# Altium schematic symbol library Altium_Lib.SchLib: 403 symbols (part 1 of 4)
Pins are listed as number, name and electrical type; pins without a type are passive.

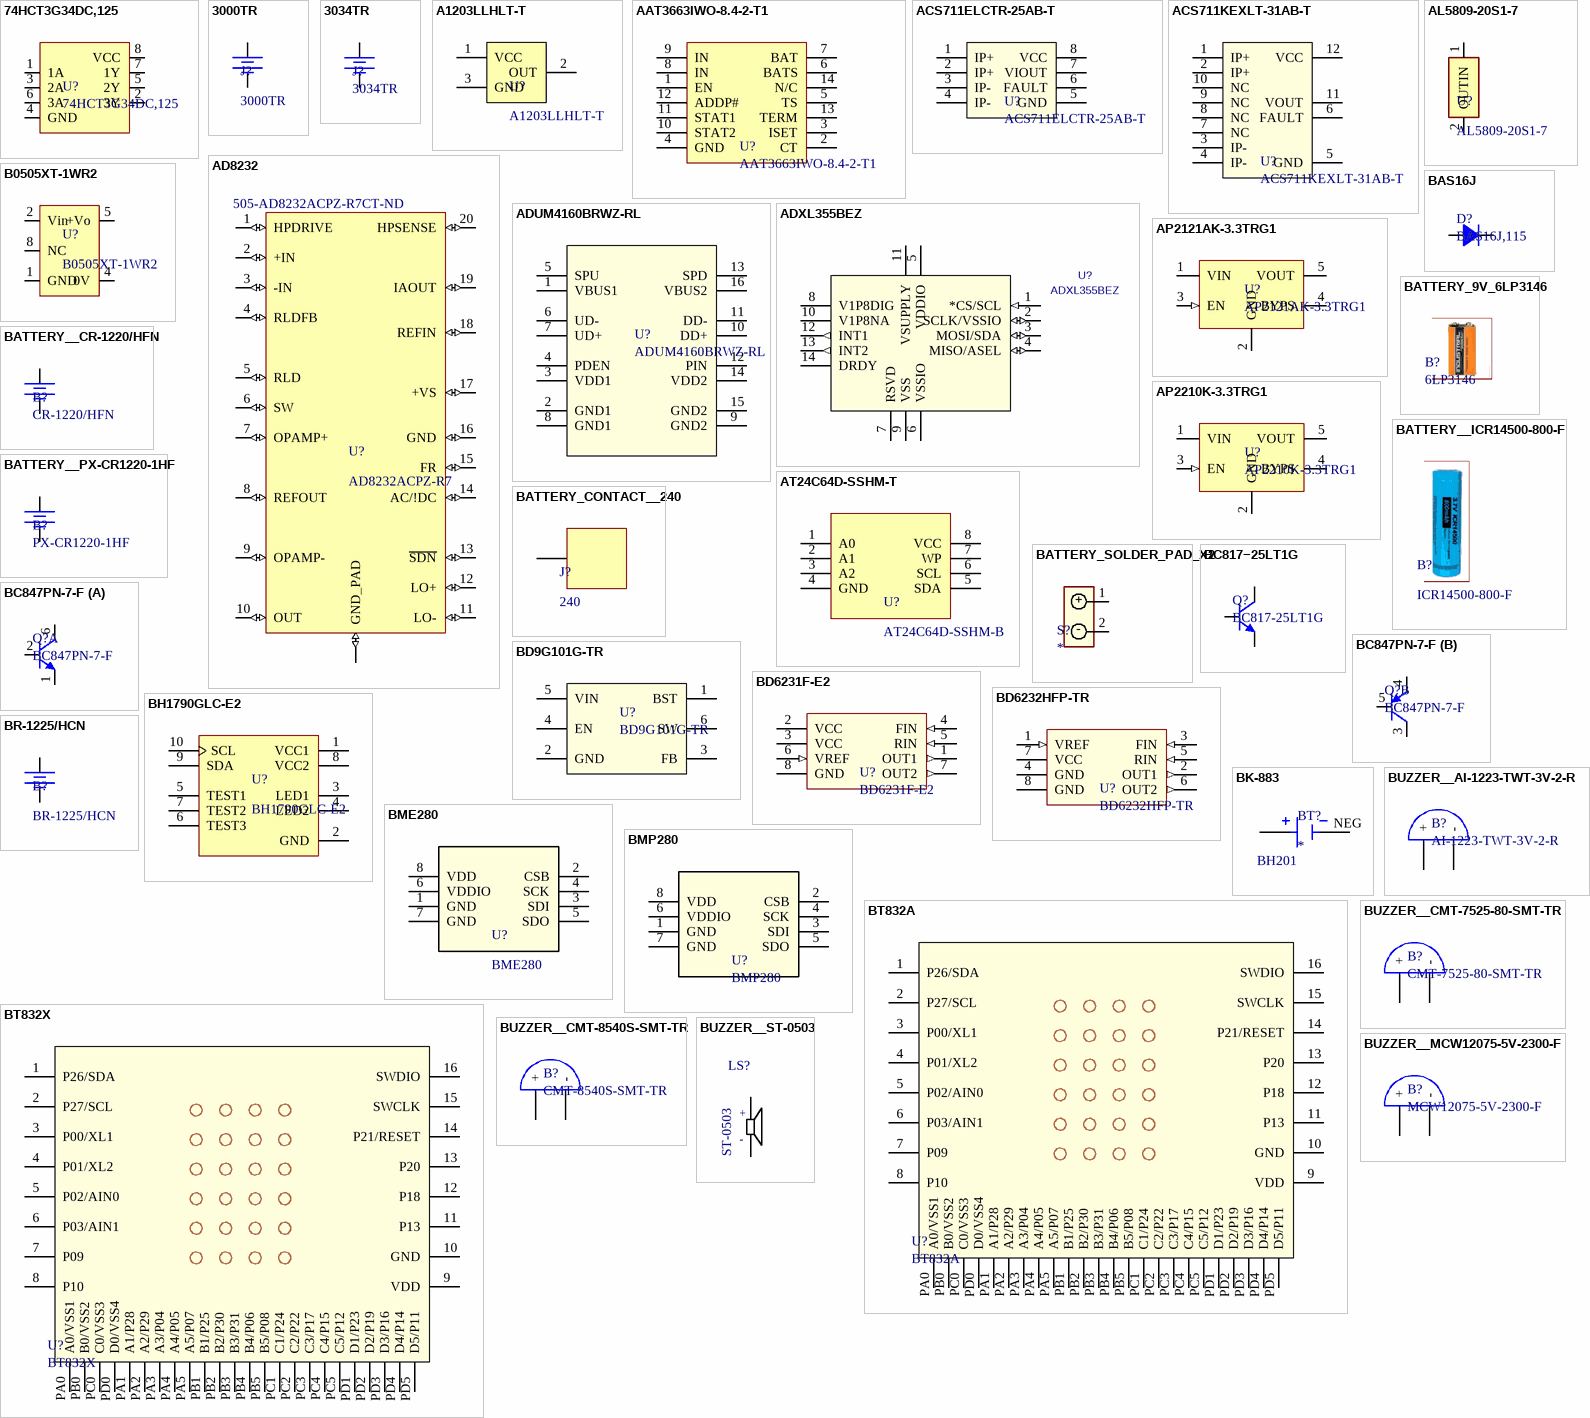
[diagram p0: symbols 74HCT3G34DC,125 to BUZZER__ST-0503]

## 74HCT3G34DC,125
designator U?
IC BUFFER TRPL NON-INV 8VSSOP; Manufacturer: Nexperia USA Inc.; Voltage - Supply: 4.5 V ~ 5.5 V; Number of Bits per Element: 1; Output Type: Push-Pull; Current - Output High, Low: 4mA, 4mA; Logic Type: Buffer, Non-Inverting; Part Status: Active; Input Type: -; Package / Case: 8-VFSOP (0.091", 2.30mm Width); Supplier: Digi-Key; RoHS: RoHS Compliant; Mounting Type: Surface Mount; Category: Integrated Circuits (ICs); Manufacturer Part Number: 74HCT3G34DC,125; Supplier Device Package: 8-VSSOP; Packaging: Tape & Reel (TR); Operating Temperature: -40°C ~ 125°C (TA); ComponentLink1URL: http://assets.nexperia.com/documents/data-sheet/74HC_HCT3G34.pdf; ComponentLink1Description: http://assets.nexperia.com/documents/data-sheet/74HC_HCT3G34.pdf; Supplier Part Number: 1727-6494-2-ND
footprint VSSOP-8
pins: 1 1A, 2 3Y, 3 2A, 4 GND, 5 2Y, 6 3A, 7 1Y, 8 VCC

## 3000TR
designator J?
BATTERY RETAINER COIN 12MM SMD; Manufacturer: KEYSTONE; Supplier 1: Future Electronics; Manufacturer Part Number: 3000TR; RoHS: Y; Category: Battery Holders & Accessories; Stock 1: 0; Pricing 1: 1000=0,4250 (USD); Dimension: 3.2 x 12.1 x 18.9 mm; ComponentLink1URL: http://www.keyelco.com/product-pdf.cfm?p=4027; ComponentLink1Description: http://www.keyelco.com/product-pdf.cfm?p=4027; Supplier Part Number 1: 4513800
footprint Keystone_3000TR
pins: 1 + (power), 2 - (power)

## 3034TR
designator J?
SMT HOLDER FOR 20MM CELL; Manufacturer: Keystone Electronics; Battery Series: 2020, 2025, 2032; Style: Retainer; Number of Cells: 1; Battery Cell Size: Coin, 20.0mm; Battery Type, Function: Coin Cell, Retainer; Termination Style: SMD (SMT) Tab; Part Status: Active; Category: Battery Products; RoHS: RoHS Compliant; Mounting Type: PCB, Surface Mount; Supplier: Digi-Key; Manufacturer Part Number: 3034TR; Height Above Board: 0.160" (4.06mm); Operating Temperature: -; ComponentLink1URL: http://www.keyelco.com/product-pdf.cfm?p=798; ComponentLink1Description: http://www.keyelco.com/product-pdf.cfm?p=798; Pricing: 500=0.3135, 1000=0.22216, 1500=0.2143, 2500=0.20312, 5000=0.19043, 12500=0.17138, 25000=0.16884, 50000=0.16504 (USD); Supplier Part Number: 36-3034TR-ND
footprint Keystone_3034TR
pins: 1 + (power), 2 - (power)

## A1203LLHLT-T
designator U?
MAGNETIC SWITCH LATCH SOT23W; Manufacturer: Allegro MicroSystems; Manufacturer Part Number: A1203LLHLT-T
footprint SOT23_W (SOT23, 3-Leads, Body 2.9x1.3mm, Pitch 0.95mm, Lead Span 2.3mm, IPC High Density)
pins: 1 VCC, 2 OUT, 3 GND

## AAT3663IWO-8.4-2-T1
designator U?
IC LI-ION CHARGER 14-DFN; Manufacturer: Skyworks Solutions Inc.; Battery Chemistry: Lithium-Ion/Polymer; Number of Cells: 2; Current - Charging: Constant - Programmable; Programmable Features: Current; Fault Protection: Over Current, Over Temperature, Over Voltage, Short Circuit; Charge Current - Max: 1A; Battery Pack Voltage: 8.4V; Voltage - Supply (Max): 13.2V; Interface: USB; Manufacturer Part Number: AAT3663IWO-8.4-2-T1; Category: Integrated Circuits (ICs); Supplier: Digi-Key; RoHS: RoHS Compliant; Packaging: Tape & Reel (TR); Part Status: Active; Operating Temperature: -40°C ~ 85°C (TA); Package / Case: 14-WFDFN Exposed Pad; Supplier Device Package: 14-TDFN (3x3); ComponentLink1URL: http://www.skyworksinc.com/uploads/documents/AAT3663_201878C.pdf; ComponentLink1Description: http://www.skyworksinc.com/uploads/documents/AAT3663_201878C.pdf; Pricing: 1500=0.74385, 3000=0.69255, 7500=0.6669, 10500=0.648 (USD); Supplier Part Number: 863-1544-2-ND
footprint DFN-14__(3x3)
pins: 0 EP hidden to GND, 1 EN, 2 CT, 3 ISET, 4 GND, 5 TS, 6 BATS, 7 BAT, 8 IN, 9 IN, 10 STAT2, 11 STAT1, 12 ADDP#, 13 TERM, 14 N/C

## ACS711ELCTR-25AB-T
designator U?
SENSOR CURRENT HALL 25A AC/DC; Manufacturer: Allegro MicroSystems, LLC; Sensitivity: 55mV/A; Polarization: Bidirectional; Sensor Type: Hall Effect, Open Loop; Output: Ratiometric, Voltage; Response Time: 4.6µs; Linearity: ±1%; Voltage - Supply: 3 V ~ 5.5 V; Accuracy: ±4%; Current - Supply (Max): 5.5mA; Frequency: DC ~ 100kHz; For Measuring: AC/DC; Package / Case: 8-SOIC (0.154", 3.90mm Width); RoHS: RoHS Compliant; Category: Sensors, Transducers; Mounting Type: Surface Mount; Part Status: Active; Operating Temperature: -40°C ~ 85°C; Current - Sensing: 25A; Supplier: Digi-Key; Manufacturer Part Number: ACS711ELCTR-25AB-T; Packaging: Cut Tape (CT); ComponentLink1URL: http://www.allegromicro.com/~/media/Files/Datasheets/ACS711-Datasheet.ashx; ComponentLink1Description: http://www.allegromicro.com/~/media/Files/Datasheets/ACS711-Datasheet.ashx; Pricing: 1=3.36, 5=3.116, 10=2.588, 25=2.1568, 50=1.9174, 100=1.8214, 500=1.53384, 1000=1.43798 (USD); Supplier Part Number: 620-1371-1-ND
footprint SOIC-8_L (SOIC, 8-Leads, Body 4.9x3.9mm, Pitch 1.27mm, IPC High Density)
pins: 1 IP+, 2 IP+, 3 IP-, 4 IP-, 5 GND, 6 FAULT, 7 VIOUT, 8 VCC

## ACS711KEXLT-31AB-T
designator U?
SENSOR CURRENT HALL 31A AC/DC; Manufacturer: Allegro MicroSystems, LLC; Voltage - Supply: 3 V ~ 5.5 V; Response Time: 4.6µs; Current - Supply (Max): 5.5mA; Polarization: Bidirectional; Sensor Type: Hall Effect, Open Loop; Frequency: DC ~ 100kHz; Output: Ratiometric, Voltage; Accuracy: ±4%; Linearity: ±1%; Sensitivity: 45mV/A; Mounting Type: Surface Mount; Package / Case: 12-WFQFN; Operating Temperature: -40°C ~ 125°C; Category: Sensors, Transducers; Manufacturer Part Number: ACS711KEXLT-31AB-T; Current - Sensing: 31A; RoHS: RoHS Compliant; Packaging: Cut Tape (CT); Supplier: Digi-Key; For Measuring: AC/DC; Part Status: Active; ComponentLink1URL: http://www.allegromicro.com/~/media/Files/Datasheets/ACS711-Datasheet.ashx; ComponentLink1Description: http://www.allegromicro.com/~/media/Files/Datasheets/ACS711-Datasheet.ashx; Pricing: 1=1.82, 5=1.756, 10=1.426, 25=1.2288, 50=1.0644, 100=0.9656, 500=0.81196 (USD); Supplier Part Number: 620-1482-1-ND
footprint WFQFN-12
pins: 1 IP+, 2 IP+, 3 IP-, 4 IP-, 5 GND, 6 FAULT, 7 NC, 8 NC, 9 NC, 10 NC, 11 VOUT, 12 VCC

## AD8232
designator U?, comment AD8232ACPZ-R7  Supplier Part Number 1: 505-AD8232ACPZ-R7CT-ND
IC AFE HEART MONITOR 20LFCSP; Manufacturer: Analog Devices; Common Mode Rejection Ratio: 80dB; Nominal Supply Current: 170uA; Input Offset Voltage (Vos): 3mV; Power Supply Rejection Ratio (PSRR): 90dB; Max Supply Voltage: 3.5V; Input Bias Current: 50pA; Min Supply Voltage: 2V; Supplier 1: Digi-Key; Manufacturer Part Number: AD8232ACPZ-R7; RoHS: Yes; Category: Amplifiers - Op Amps, Buffer, Instrumentation; Stock 1: 2185; Pricing 1: 1=5,17000, 10=4,64200, 25=4,38840, 100=3,80330, 250=3,60824, 500=3,23766 (USD); Mount: Surface Mount; Case/Package: LFCSP EP; Number of Pins: 20; Contact Plating: Tin,Matte; Min Operating Temperature: -40°C; Max Operating Temperature: 85°C; Packaging: Tape and Reel; Package Quantity: 1500; Series: -; Operating Supply Current: 170uA; Supply Current: 170uA; Lead Free: Contains Lead; RoHS Compliant: Yes; Reach SVHC Compliant: Yes; ComponentLink1URL: https://datasheet.ciiva.com/6579/ad8232-6579751.pdf?src-supplier=Digi-Key; ComponentLink1Description: Datasheet
footprint LFCSP_20
pins: 1 HPDRIVE (io), 2 +IN (io), 3 -IN (io), 4 RLDFB (io), 5 RLD (io), 6 SW (io), 7 OPAMP+ (io), 8 REFOUT (io), 9 OPAMP- (io), 10 OUT (io), 11 LO- (io), 12 LO+ (io), 13 ~{SDN} (io), 14 AC/!DC (io), 15 FR (io), 16 GND (io), 17 +VS (io), 18 REFIN (io), 19 IAOUT (io), 20 HPSENSE (io), PAD GND_PAD (io)

## ADUM4160BRWZ-RL
designator U?
DGTL ISOLATOR 5KV 2CH USB 16SOIC; Manufacturer: Mouser Electronics; Get more results: Please configure for MyMouser login credentials; Product Status: New Product; Supplier 1: Mouser; Manufacturer Part Number: ADUM4160BRWZ-RL; RoHS: RoHS Compliant; Category: Isolators; Stock 1: 0; Pricing 1: 1=0.00 (USD); Create Account URL: https://www.mouser.com/MyMouser/CreateAccount.aspx; Login URL: https://www.mouser.com/MyMouser/MouserLogin.aspx; Minimum Order Quantity: 1; Reeling: False
footprint SOIC-16_W
pins: 1 VBUS1, 2 GND1, 3 VDD1, 4 PDEN, 5 SPU, 6 UD-, 7 UD+, 8 GND1, 9 GND2, 10 DD+, 11 DD-, 12 PIN, 13 SPD, 14 VDD2, 15 GND2, 16 VBUS2

## ADXL355BEZ
designator U?
ACCELEROMETER2-4-8GDIGTL14QFN; Manufacturer: Analog Devices; Output Type: SPI,I2C; Axis: X, Y, Z; Bandwidth: 1.5kHz; Supplier 1: Digi-Key; Manufacturer Part Number: ADXL355BEZ; RoHS: Yes; Category: Accelerometers; Stock 1: 3514; Pricing 1: 1=57,68000, 10=54,18800, 25=52,44000 (USD); Mount: Surface Mount; Case/Package: CLCC; Number of Pins: 14; Min Operating Temperature: -40°C; Max Operating Temperature: 125°C; Packaging: Tray; Lead Free: Contains Lead; RoHS Compliant: Yes; ComponentLink2URL: https://www.analog.com/media/en/technical-documentation/data-sheets/ADXL354_355.pdf?src-supplier=Digi-Key; ComponentLink2Description: Datasheet; Supplier Part Number 1: 505-ADXL355BEZ-ND
footprint ADXL355
pins: 1 *CS/SCL (in), 2 SCLK/VSSIO (io), 3 MOSI/SDA (io), 4 MISO/ASEL (io), 5 VDDIO (power), 6 VSSIO (power), 7 RSVD, 8 V1P8DIG (power), 9 VSS (power), 10 V1P8NA (power), 11 VSUPPLY (power), 12 INT1 (out), 13 INT2 (out), 14 DRDY

## AL5809-20S1-7
designator U?
IC LED DRVR LIN PWM 20MA SOD123; Manufacturer: Diodes Incorporated; Number of Channels: 1 Channel; Pd - Power Dissipation: 360 mW; Supplier 1: Mouser; Manufacturer Part Number: AL5809-20S1-7; RoHS: RoHS Compliant; Category: LED Lighting Drivers; Stock 1: 3694; Pricing 1: 1=0.490, 10=0.407, 100=0.248, 1000=0.192, 3000=0.164 (USD); Height: 1.35 mm; Length: 2.85 mm; Output Current: 20 mA; Package / Case: SOD-123-2; Packaging: Cut Tape; Product: LED Drivers; Series: AL580; Type: Linear LED Driver; Width: 1.7 mm; Brand: Diodes Incorporated; Mounting Style: SMD/SMT; Moisture Sensitive: Yes; Product Type: LED Lighting Drivers; Standard Pack Qty: 3000; Subcategory: Driver ICs; RoHS - Mouser: Y; Minimum Order Quantity: 1; Reeling: True; ComponentLink1URL: https://www.mouser.com/datasheet/2/115/AL5809-466856.pdf; ComponentLink1Description: https://www.mouser.com/datasheet/2/115/AL5809-466856.pdf; Supplier Part Number 1: 621-AL5809-20S1-7
footprint SOD123
pins: 1 IN, 2 OUT

## AP2121AK-3.3TRG1
designator U?
IC REG LDO 3.3V 0.2A SOT25; Manufacturer: Diodes; Dropout Voltage: 250mV; Output Current: 200mA; Number of Regulators: 1; Min Input Voltage: 2V; Max Input Voltage: 6V; Quiescent Current: 50uA; Polarity: Positive; Accuracy: 2%; Output Type: Fixed; Supplier 1: Digi-Key; Manufacturer Part Number: AP2121AK-3.3TRG1; RoHS: Yes; Category: Voltage Regulators - Linear; Stock 1: 12709; Pricing 1: 1=0,39000, 10=0,29400, 25=0,26480, 100=0,18290, 250=0,15400, 500=0,12512, 1000=0,09625 (USD); Mount: Surface Mount; Case/Package: SOT-23-5; Number of Pins: 5; Min Operating Temperature: -40°C; Max Operating Temperature: 85°C; Output Voltage: 3.3V; Packaging: Tape and Reel; Number of Outputs: 1; Package Quantity: 3000; Max Output Current: 200mA; Length: 3.02mm; Width: 1.7mm; Height: 1.3mm; Lead Free: Lead Free; RoHS Compliant: Yes; ComponentLink1URL: https://datasheet.ciiva.com/30016/ap2121-30016742.pdf?src-supplier=Avnet; ComponentLink1Description: https://datasheet.ciiva.com/30016/ap2121-30016742.pdf?src-supplier=Avnet; ComponentLink2URL: https://datasheet.ciiva.com/29569/ap2121-29569066.pdf?src-supplier=Digi-Key; ComponentLink2Description: https://datasheet.ciiva.com/29569/ap2121-29569066.pdf?src-supplier=Digi-Key; ComponentLink3URL: https://datasheet.ciiva.com/29569/ap2121-29569067.pdf?src-supplier=Digi-Key; ComponentLink3Description: https://datasheet.ciiva.com/29569/ap2121-29569067.pdf?src-supplier=Digi-Key; ComponentLink4URL: https://datasheet.ciiva.com/29569/ap2121-29569065.pdf?src-supplier=Digi-Key; ComponentLink4Description: https://datasheet.ciiva.com/29569/ap2121-29569065.pdf?src-supplier=Digi-Key; Supplier Part Number 1: AP2121AK-3.3TRG1DICT-ND
footprint SOT23-5 (SOT-23/SC-74A; 5 Leads; Body 3 x 3 mm, inc. leads (LxW max))
pins: 1 VIN (power), 2 GND (power), 3 EN (in), 4 BYPS, 5 VOUT (power)

## AP2210K-3.3TRG1
designator U?
IC REG LDO 3.3V 0.3A SOT25; Manufacturer: Diodes Incorporated; Current - Output: 300mA; Number of Regulators: 1; Regulator Topology: Positive Fixed; Voltage - Dropout (Typical): 0.25V @ 300mA; Voltage - Input: Up to 13.2V; Category: Integrated Circuits (ICs); Current - Limit (Min): -; Manufacturer Part Number: AP2210K-3.3TRG1; Mounting Type: Surface Mount; Operating Temperature: -40°C ~ 125°C; Package / Case: SC-74A, SOT-753; Packaging: Tape & Reel (TR); Part Status: Active; RoHS: RoHS Compliant; Supplier: Digi-Key; Supplier Device Package: SOT-23-5; Voltage - Output: 3.3V; ComponentLink1URL: http://www.diodes.com/_files/datasheets/AP2210.pdf; ComponentLink1Description: http://www.diodes.com/_files/datasheets/AP2210.pdf; Pricing: 3000=0.09072, 6000=0.08568, 15000=0.07812, 30000=0.07308, 75000=0.06552, 150000=0.063 (USD); Supplier Part Number: AP2210K-3.3TRG1DITR-ND
footprint SOT23-5 (SOT-23/SC-74A; 5 Leads; Body 3 x 3 mm, inc. leads (LxW max))
pins: 1 VIN (power), 2 GND (power), 3 EN (in), 4 BYPS, 5 VOUT (power)

## AT24C64D-SSHM-T
designator U?, comment AT24C64D-SSHM-B
EEPROM SERIAL EEPROM 64K 2-WIRE 1.7V; Manufacturer: Microchip; Organization: 8 k x 8; Memory Size: 64 kbit; Operating Supply Current: 3 mA; Operating Supply Voltage: 1.8 V, 2.5 V, 3.3 V, 5 V; Access Time: 550 ns; Supply Voltage - Max: 5.5 V; Interface Type: Serial, 2-Wire, I2C; Data Retention: 100 Year; Brand: Microchip Technology / Atmel; Maximum Clock Frequency: 1 MHz; Supplier: Mouser; Package / Case: SOIC-8; Length: 4.98 mm (Max); Reeling: False; Minimum Operating Temperature: - 40 C; Height: 1.48 mm (Max); Product Type: EEPROM; Supply Voltage - Min: 1.7 V; Category: EEPROM; RoHS: RoHS Compliant; Packaging: Tube; Manufacturer Part Number: AT24C64D-SSHM-B; Subcategory: Memory & Data Storage; Width: 3.99 mm (Max); Series: AT24C64D; Minimum Order Quantity: 1; RoHS - Mouser: Y; Maximum Operating Temperature: + 85 C; Mounting Style: SMD/SMT; Supply Current - Max: 3 mA; Standard Pack Qty: 100; ComponentLink1URL: https://www.mouser.com/datasheet/2/268/atmel-8850-seeprom-at24c64d-datasheet-1368843.pdf; ComponentLink1Description: https://www.mouser.com/datasheet/2/268/atmel-8850-seeprom-at24c64d-datasheet-1368843.pdf; Pricing: 1=0.320, 25=0.319, 100=0.309 (USD); Stock: 2832; Supplier Part Number: 556-AT24C64D-SSHM-B
footprint SOIC-8_L (SOIC, 8-Leads, Body 4.9x3.9mm, Pitch 1.27mm, IPC High Density)
pins: 1 A0, 2 A1, 3 A2, 4 GND, 5 SDA, 6 SCL, 7 WP, 8 VCC

## B0505XT-1WR2
designator U?
DC/DC CONV 1W 4.4-5.5VDC 5VDC 200mA; Manufacturer: MORNSUN; Input Voltage: 4.4~5.5VDC; Isolation: 1.5kV; Efficiency: 80%; Manufacturer Part Number: B0505XT-1WR2; Output Power (Max): 1W; Output Voltage: 5VDC; Output Current: 200mA
footprint B_XT-1WR2
pins: 1 GND, 2 Vin, 4 0V, 5 +Vo, 8 NC

## BAS16J
designator D?, comment BAS16J,115
DIODE GEN PURP 100V 250MA SOD323; Manufacturer: Nexperia USA Inc.; Capacitance @ Vr, F: 1.5pF @ 0V, 1MHz; Current - Average Rectified (Io): 250mA (DC); Current - Reverse Leakage @ Vr: 500nA @ 80V; Diode Type: Standard; Reverse Recovery Time (trr): 4ns; Speed: Fast Recovery =< 500ns, > 200mA (Io); Voltage - Forward (Vf) (Max) @ If: 1.25V @ 150mA; Category: Discrete Semiconductor Products; Manufacturer Part Number: BAS16J,115; Mounting Type: Surface Mount; Operating Temperature - Junction: 150°C (Max); Package / Case: SC-90, SOD-323F; Packaging: Tape & Reel (TR); Part Status: Active; RoHS: RoHS Compliant; Supplier: Digi-Key; Supplier Device Package: SOD-323F; Voltage - DC Reverse (Vr) (Max): 100V; ComponentLink1URL: http://assets.nexperia.com/documents/data-sheet/BAS16_SER.pdf; ComponentLink1Description: http://assets.nexperia.com/documents/data-sheet/BAS16_SER.pdf; Pricing: 3000=0.03137, 6000=0.02829, 15000=0.0246, 30000=0.02214, 75000=0.01968, 150000=0.01636 (USD); Supplier Part Number: 1727-6169-2-ND
footprint SOD323F__SC90
pins: 1 A, 2 K

## BATTERY_9V_6LP3146
designator B?, comment 6LP3146
9V industrial non rechargeable battery; Manufacturer: Duracell; Manufacturer Part Number: 6LP3146
footprint BATTERY_9V_6LP3146

## BATTERY__CR-1220/HFN
designator B?, comment CR-1220/HFN
Lithium Manganese Dioxide Coin 3V 0.035Ah Primary; Manufacturer: Panasonic BSG; Capacity: 35mAh; Battery Size: 1220; Outside Diameter: 12.5mm; Supplier 1: Future Electronics; Manufacturer Part Number: CR-1220/HFN; Stock 1: 0; Pricing 1: 40=0.845, 160=0.725, 600=0.7, 1000=0.69, 2000=0.675 (USD); Mount: Through Hole; Weight: 1.2g; Contact Plating: Tin; Min Operating Temperature: -30°C; Max Operating Temperature: 60°C; Chemistry/Technology: Lithium; Voltage Rating: 3V; Series: CR; Termination: Through Hole; Orientation: Horizontal; Battery Chemistry: LITHIUM; Diameter: 12mm; Height: 2mm; REACH SVHC: Yes; Lead Free: Lead Free; RoHS Compliant: Yes; ComponentLink1URL: https://na.industrial.panasonic.com/sites/default/pidsa/files/panasonic-lithium-cr1220-datasheet.pdf?src-supplier=Digi-Key; ComponentLink1Description: https://na.industrial.panasonic.com/sites/default/pidsa/files/panasonic-lithium-cr1220-datasheet.pdf?src-supplier=Digi-Key; Supplier Part Number 1: 8052774
footprint CR-1220/HFN
pins: 1 + (power), 2 - (power)

## BATTERY__ICR14500-800-F
designator B?, comment ICR14500-800-F
ICR14500 800MAH 3.7V BUTTON TOP; Manufacturer: PKCELL; Manufacturer Part Number: ICR14500-800-F; Minimum Order Quantity: 1

## BATTERY__PX-CR1220-1HF
designator B?, comment PX-CR1220-1HF
Manufacturer: Power-Xtra; Capacity: 35mAh; Chemistry/Technology: Lithium; Voltage Rating: 3V; Battery Size: 1220; Outside Diameter: 12.5mm; Manufacturer Part Number: PX-CR1220-1HF; Mount: Through Hole; Weight: 1.2g; Max Operating Temperature: 60°C; Series: CR; Termination: Through Hole; Orientation: Horizontal; Battery Chemistry: LITHIUM; Diameter: 12mm; Height: 2mm
footprint CR-1220-1HF
pins: 1 + (power), 2 - (power)

## BATTERY_CONTACT__240
designator J?, comment 240
Cylindrical Battery Contacts, Clips, Holders & Springs NEGATIVE SPRING CONTACT; Manufacturer: Keystone Electronics; Get more results: Please configure for MyMouser login credentials; Product Status: New Product; Supplier 1: Mouser; Manufacturer Part Number: 240; RoHS: RoHS Compliant; Category: Cylindrical Battery Contacts, Clips, Holders & Springs; Stock 1: 0; Pricing 1: 1=0.00 (EUR); Minimum Order Quantity: 1; Reeling: False
footprint BATTERY_CONTACT__240
pins: 1

## BATTERY_SOLDER_PAD_X2
designator S?
Solder hole X2; ComponentLink1Description: *; Manufacturer Part Number: *; Manufacturer: *
footprint BATTERY_SOLDER_PAD_X2
pins: 1 + (power), 2 + (power)
text: -

## BC817−25LT1G
designator Q?, comment BC817-25LT1G
TRANS NPN 45V 0.5A SOT23; Manufacturer: ON Semiconductor; Current - Collector (Ic) (Max): 500mA; Current - Collector Cutoff (Max): 100nA (ICBO); DC Current Gain (hFE) (Min) @ Ic, Vce: 160 @ 100mA, 1V; Frequency - Transition: 100MHz; Power - Max: 300mW; Vce Saturation (Max) @ Ib, Ic: 700mV @ 50mA, 500mA; Category: Discrete Semiconductor Products; Manufacturer Part Number: BC817-25LT1G; Mounting Type: Surface Mount; Operating Temperature: -65°C ~ 150°C (TJ); Package / Case: TO-236-3, SC-59, SOT-23-3; Packaging: Tape & Reel (TR); Part Status: Active; RoHS: RoHS Compliant; Supplier: Digi-Key; Supplier Device Package: SOT-23-3 (TO-236); Transistor Type: NPN; Voltage - Collector Emitter Breakdown (Max): 45V; ComponentLink1URL: http://www.onsemi.com/pub_link/Collateral/BC817-16LT1-D.PDF; ComponentLink1Description: http://www.onsemi.com/pub_link/Collateral/BC817-16LT1-D.PDF; Pricing: 3000=0.01976, 6000=0.01783, 15000=0.0155, 30000=0.01395, 75000=0.0124, 150000=0.01031 (USD); Supplier Part Number: BC817-25LT1GOSTR-ND
footprint SOT23_L (SOT23, 3-Leads, Body 2.9x1.3mm, Pitch 0.95mm, Lead Span 2.3mm, IPC High Density)
pins: 1 B, 2 E, 3 C

## BC847PN-7-F
designator Q?
TRANS NPN/PNP 45V 0.1A SOT363; Manufacturer: Diodes Incorporated; Frequency - Transition: 300MHz, 200MHz; Transistor Type: NPN, PNP; DC Current Gain (hFE) (Min) @ Ic, Vce: 200 @ 2mA, 5V / 220 @ 2mA, 5V; Current - Collector Cutoff (Max): 15nA (ICBO); Vce Saturation (Max) @ Ib, Ic: 600mV @ 5mA, 100mA / 650mV @ 5mA, 100mA; Power - Max: 200mW; Current - Collector (Ic) (Max): 100mA; Category: Discrete Semiconductor Products; RoHS: RoHS Compliant; Supplier Device Package: SOT-363; Packaging: Tape & Reel (TR); Mounting Type: Surface Mount; Voltage - Collector Emitter Breakdown (Max): 45V; Package / Case: 6-TSSOP, SC-88, SOT-363; Manufacturer Part Number: BC847PN-7-F; Part Status: Active; Operating Temperature: -65°C ~ 150°C (TJ); Supplier: Digi-Key; ComponentLink1URL: https://www.diodes.com/assets/Datasheets/ds30278.pdf; ComponentLink1Description: https://www.diodes.com/assets/Datasheets/ds30278.pdf; Supplier Part Number: BC847PN-FDITR-ND
footprint SOT-363
part A pins: 1 E1, 2 B1, 6 C1
part B pins: 3 C2, 4 E2, 5 B2

## BD9G101G-TR
designator U?
IC REG BUCK ADJ 0.5A 6SSOP; Manufacturer: Rohm Semiconductor; Current - Output: 500mA; Frequency - Switching: 1.5MHz; Synchronous Rectifier: No; Output Configuration: Positive; Function: Step-Down; Number of Outputs: 1; Voltage - Output (Max): 29.4V; Voltage - Output (Min/Fixed): 1V; Voltage - Input (Max): 42V; Voltage - Input (Min): 6V; Output Type: Adjustable; Mounting Type: Surface Mount; Manufacturer Part Number: BD9G101G-TR; Packaging: Cut Tape (CT); Part Status: Active; Topology: Buck; Supplier: Digi-Key; Category: Integrated Circuits (ICs); Supplier Device Package: 6-SSOP; Package / Case: SOT-23-6; Operating Temperature: -40°C ~ 105°C (TA); RoHS: RoHS Compliant; Base Part Number: BD9G101; ComponentLink1URL: http://rohmfs.rohm.com/en/products/databook/datasheet/ic/power/switching_regulator/bd9g101g-e.pdf; ComponentLink1Description: http://rohmfs.rohm.com/en/products/databook/datasheet/ic/power/switching_regulator/bd9g101g-e.pdf; Pricing: 1=1.78, 10=1.581 (USD); Supplier Part Number: BD9G101G-CT-ND
footprint SOT23-6 (SOT-23/SC-74A; 5 Leads; Body 3 x 3 mm, inc. leads (LxW max))
pins: 1 BST, 2 GND, 3 FB, 4 EN, 5 VIN, 6 SW

## BD6231F-E2
designator U?
IC MOTOR DRIVER PAR 8SOP; Manufacturer: Rohm Semiconductor; Function: Driver - Fully Integrated, Control and Power Stage; Interface: On/Off; Output Configuration: Half Bridge (2); Motor Type - AC, DC: Brushed DC; Voltage - Supply: 6 V ~ 32 V; Current - Output: 1A; Operating Temperature: -40°C ~ 150°C (TJ); Supplier Device Package: 8-SOP; Part Status: Active; Applications: Media Player; Motor Type - Stepper: -; RoHS: RoHS Compliant; Step Resolution: -; Package / Case: 8-SOIC (0.173", 4.40mm Width); Mounting Type: Surface Mount; Technology: Power MOSFET; Packaging: Tape & Reel (TR); Category: Integrated Circuits (ICs); Voltage - Load: 6 V ~ 32 V; Supplier: Digi-Key; Manufacturer Part Number: BD6231F-E2; ComponentLink1URL: http://rohmfs.rohm.com/en/products/databook/datasheet/ic/motor/dc/bd623x-e.pdf; ComponentLink1Description: http://rohmfs.rohm.com/en/products/databook/datasheet/ic/motor/dc/bd623x-e.pdf; Pricing: 2500=1.5827, 5000=1.5232 (USD); Supplier Part Number: BD6231F-E2TR-ND
footprint SOP-8 (SOP, 8-Leads, Body 4.9x3.9mm, Pitch 1.27mm, IPC Low Density)
pins: 1 OUT1 (out) "Driver output", 2 VCC (power) "Power supply", 3 VCC (power) "Power supply", 4 FIN (in) "Control input (forward)", 5 RIN (in) "Control input (reverse)", 6 VREF (in) "Duty setting pin", 7 OUT2 (out) "Driver output", 8 GND (power) "Ground"

## BD6232HFP-TR
designator U?
IC MOTOR DRIVER PAR HRP7; Manufacturer: Rohm Semiconductor; Output Configuration: Half Bridge (2); Motor Type - AC, DC: Brushed DC; Voltage - Load: 6 V ~ 32 V; Function: Driver - Fully Integrated, Control and Power Stage; Interface: On/Off; Current - Output: 2A; Operating Temperature: -40°C ~ 150°C (TJ); Voltage - Supply: 6 V ~ 32 V; Technology: Power MOSFET; Motor Type - Stepper: -; Step Resolution: -; Applications: Media Player; Packaging: Cut Tape (CT); Manufacturer Part Number: BD6232HFP-TR; RoHS: RoHS Compliant; Part Status: Active; Mounting Type: Surface Mount; Supplier Device Package: HRP7; Package / Case: TO-263-8, D²Pak (7 Leads + Tab), TO-263CA; Category: Integrated Circuits (ICs); Supplier: Digi-Key; ComponentLink1URL: http://rohmfs.rohm.com/en/products/databook/datasheet/ic/motor/dc/bd623x-e.pdf; ComponentLink1Description: http://rohmfs.rohm.com/en/products/databook/datasheet/ic/motor/dc/bd623x-e.pdf; Pricing: 1=5.59, 10=4.996, 25=4.496, 100=4.0963, 250=3.69668, 500=3.31702, 1000=2.79748 (USD); Supplier Part Number: BD6232HFPCT-ND
footprint ROHM-HRP7_L
pins: 1 VREF (in) "Duty setting pin", 2 OUT1 (out) "Driver output", 3 FIN (in) "Control input (forward)", 4 GND (power) "Power supply", 5 RIN (in) "Control input (reverse)", 6 OUT2 (out) "Driver output", 7 VCC (power) "Power supply", 8 GND (power) "Ground"

## BH1790GLC-E2
designator U?
Optical Sensor for Heart Rate Monitor IC, WLGA010V28M, RoHS; Manufacturer: Rohm; Output Type: I2C; Supplier 1: Digi-Key; Manufacturer Part Number: BH1790GLC-E2; RoHS: Yes; Category: Optical Sensors; Stock 1: 6667; Pricing 1: 1=9,67000, 5=8,48400, 10=7,63600, 25=6,78720, 50=6,27820, 100=5,42980, 500=5,09040, 1000=4,75104 (USD); Min Operating Temperature: -20°C; Max Operating Temperature: 85°C; RoHS Compliant: Yes; ComponentLink1URL: https://www.rohm.com/datasheet/BH1790GLC/bh1790glc-e?src-supplier=Digi-Key; ComponentLink1Description: Datasheet; Supplier Part Number 1: BH1790GLC-E2CT-ND
footprint LGA-10
pins: 1 VCC1 (power), 2 GND (power), 3 LED1, 4 LED2, 5 TEST1, 6 TEST3, 7 TEST2, 8 VCC2 (power), 9 SDA, 10 SCL

## BK-883
designator BT?  Ozdisan: BH201
BATTERY RETAINER COIN 20MM SMD; MP: BK-883; MF: MPD; Price: None; Purchase-URL: https://pricing.snapeda.com/search/part/BK-883/?ref=eda; Package: DFN-12 Memory Protection Devices; Check_prices: https://www.snapeda.com/parts/BK-883/Memory+Protection+Devices/view-part/?ref=eda; Value: *; Availability: In Stock; SnapEDA_Link: https://www.snapeda.com/parts/BK-883/Memory+Protection+Devices/view-part/?ref=snap
footprint BAT_BK-883
pins: NEG, S1+ POS, S2+ POS

## BME280
designator U?
Board Mount Humidity Sensors; Manufacturer: Bosch; Interface Type: I2C, SPI; Brand: Bosch Sensortec; Supply Voltage - Max: 3.6 V; RH Range: 0 % to 100 %; RH Accuracy: +/- 3 %; Supply Voltage - Min: 1.7 V; Operating Supply Current: 500 nA; Operating Supply Voltage: 1.8 V; Output Type: Digital; Mounting Style: SMD/SMT; Maximum Operating Temperature: + 85 C; Supplier: Mouser; RoHS: RoHS Compliant; Minimum Operating Temperature: - 40 C; Minimum Order Quantity: 1; Product Type: Humidity Sensors; RoHS - Mouser: Y; Packaging: Reel; Category: Board Mount Humidity Sensors; Package / Case: LGA-8; Subcategory: Sensors; Standard Pack Qty: 10000; Reeling: True; Manufacturer Part Number: BME280; Product: Board Mount; ComponentLink1URL: https://www.mouser.com/datasheet/2/783/BST-BME280-DS002-1509607.pdf; ComponentLink1Description: https://www.mouser.com/datasheet/2/783/BST-BME280-DS002-1509607.pdf; Pricing: 1=6.62, 10=5.96, 25=5.30, 50=4.90, 100=4.24, 500=3.97, 1000=3.71, 5000=3.39, 10000=3.07 (USD); Supplier Part Number: 262-BME280
footprint BME280
pins: 1 GND, 2 CSB, 3 SDI, 4 SCK, 5 SDO, 6 VDDIO, 7 GND, 8 VDD

## BMP280
designator U?
SENSOR PRESSURE ABS; Manufacturer: Bosch Sensortec; Output: 16b; Accuracy: ±0.015 PSI (±0.1 kPa); Maximum Pressure: 290.08 PSI (2000 kPa); Voltage - Supply: 1.71 V ~ 3.6 V; Output Type: I²C, SPI; Operating Pressure: 4.35 PSI ~ 15.95 PSI (30 kPa ~ 110 kPa); Pressure Type: Absolute; Supplier: Digi-Key; Features: Standby Mode; Part Status: Active; Port Size: -; Supplier Device Package: 8-SMD; Manufacturer Part Number: BMP280; RoHS: RoHS Compliant; Category: Sensors, Transducers; Port Style: -; Termination Style: SMD (SMT) Tab; Package / Case: 8-SMD; Operating Temperature: -40°C ~ 85°C; ComponentLink1URL: https://ae-bst.resource.bosch.com/media/_tech/media/datasheets/BST-BMP280-DS001-19.pdf; ComponentLink1Description: https://ae-bst.resource.bosch.com/media/_tech/media/datasheets/BST-BMP280-DS001-19.pdf; Pricing: 10000=1.2369 (USD); Supplier Part Number: 828-1064-2-ND
footprint BMP280
pins: 1 GND, 2 CSB, 3 SDI, 4 SCK, 5 SDO, 6 VDDIO, 7 GND, 8 VDD

## BR-1225/HCN
designator B?
BATTERY LITHIUM 3V COIN 12.5MM; Manufacturer: Panasonic Battery; Battery Size: BR1225; Capacity: 48 mAh; Rechargeable/Non-Rechargeable: Non-Rechargeable; Battery Chemistry: Lithium Carbon Monofluoride (LiCF); Supplier 1: Mouser; Manufacturer Part Number: BR-1225/HCN; RoHS: Not Applicable; Category: Coin Cell Battery; Stock 1: 4695; Pricing 1: 1=1.68, 10=1.39, 50=1.22, 100=1.16, 250=1.08, 500=1.02, 1000=0.965, 2500=0.860 (USD); Chemistry: Lithium; Height: 2.5 mm; Operating Temperature Range: - 30 C to + 80 C; Orientation: Horizontal; Output Voltage: 3 V; Series: BR; Termination Style: PC Pins (Horizontal 2-Pin); Type: Lithium Poly-Carbonmonofluoride Batteries; Width: 12.5 mm; Brand: Panasonic Battery; Mounting Style: With Leads; Maximum Operating Temperature: + 80 C; Minimum Operating Temperature: - 30 C; Product Type: Coin Cell Battery; Standard Pack Qty: 720; Subcategory: Battery; RoHS - Mouser: N/A; Minimum Order Quantity: 1; Reeling: False; Supplier Part Number 1: 658-BR-1225/HCN
footprint BR-1225/HCN
pins: 1 + (power), 2 - (power)

## BT832A
designator U?
NRF52810 BLUETOOTH 5 MODULE; Manufacturer: Fanstel Corp.; Utilized IC / Part: nRF52832; Memory Size: 192kB Flash, 24kB RAM; Data Rate: 8Mbps; Antenna Type: Integrated, Trace; Power - Output: 4dBm; Voltage - Supply: 1.7 V ~ 3.6 V; Frequency: 2.4GHz; Serial Interfaces: I²C, I²S, SPI, UART; Protocol: Bluetooth v5.0; Sensitivity: -96dBm; Category: RF/IF and RFID; Packaging: Tape & Reel (TR); RF Family/Standard: Bluetooth; Modulation: -; Package / Case: 16-SMD Module; Current - Transmitting: -; Part Status: Active; Mounting Type: Surface Mount; Operating Temperature: -40°C ~ 85°C; RoHS: RoHS Compliant; Manufacturer Part Number: BT832A; Supplier: Digi-Key; Current - Receiving: -; ComponentLink1URL: https://media.digikey.com/pdf/Data%20Sheets/Fanstel%20PDFs/BT832_A_F_AF_V2.04_Dec-2017.pdf; ComponentLink1Description: https://media.digikey.com/pdf/Data%20Sheets/Fanstel%20PDFs/BT832_A_F_AF_V2.04_Dec-2017.pdf; Pricing: 1000=3.9285, 2000=3.783 (USD); Supplier Part Number: 1914-1011-2-ND
footprint BT832A
pins: 1 P26/SDA, 2 P27/SCL, 3 P00/XL1, 4 P01/XL2, 5 P02/AIN0, 6 P03/AIN1, 7 P09, 8 P10, 9 VDD, 10 GND, 11 P13, 12 P18, 13 P20, 14 P21/RESET, 15 SWCLK, 16 SWDIO, PA0 A0/VSS1, PA1 A1/P28, PA2 A2/P29, PA3 A3/P04, PA4 A4/P05, PA5 A5/P07, PB0 B0/VSS2, PB1 B1/P25, PB2 B2/P30, PB3 B3/P31, PB4 B4/P06, PB5 B5/P08, PC0 C0/VSS3, PC1 C1/P24, PC2 C2/P22, PC3 C3/P17, PC4 C4/P15, PC5 C5/P12, PD0 D0/VSS4, PD1 D1/P23, PD2 D2/P19, PD3 D3/P16, PD4 D4/P14, PD5 D5/P11